# Altium integrated library Mastermind Devices.IntLib: 910 symbols (part 4 of 6)
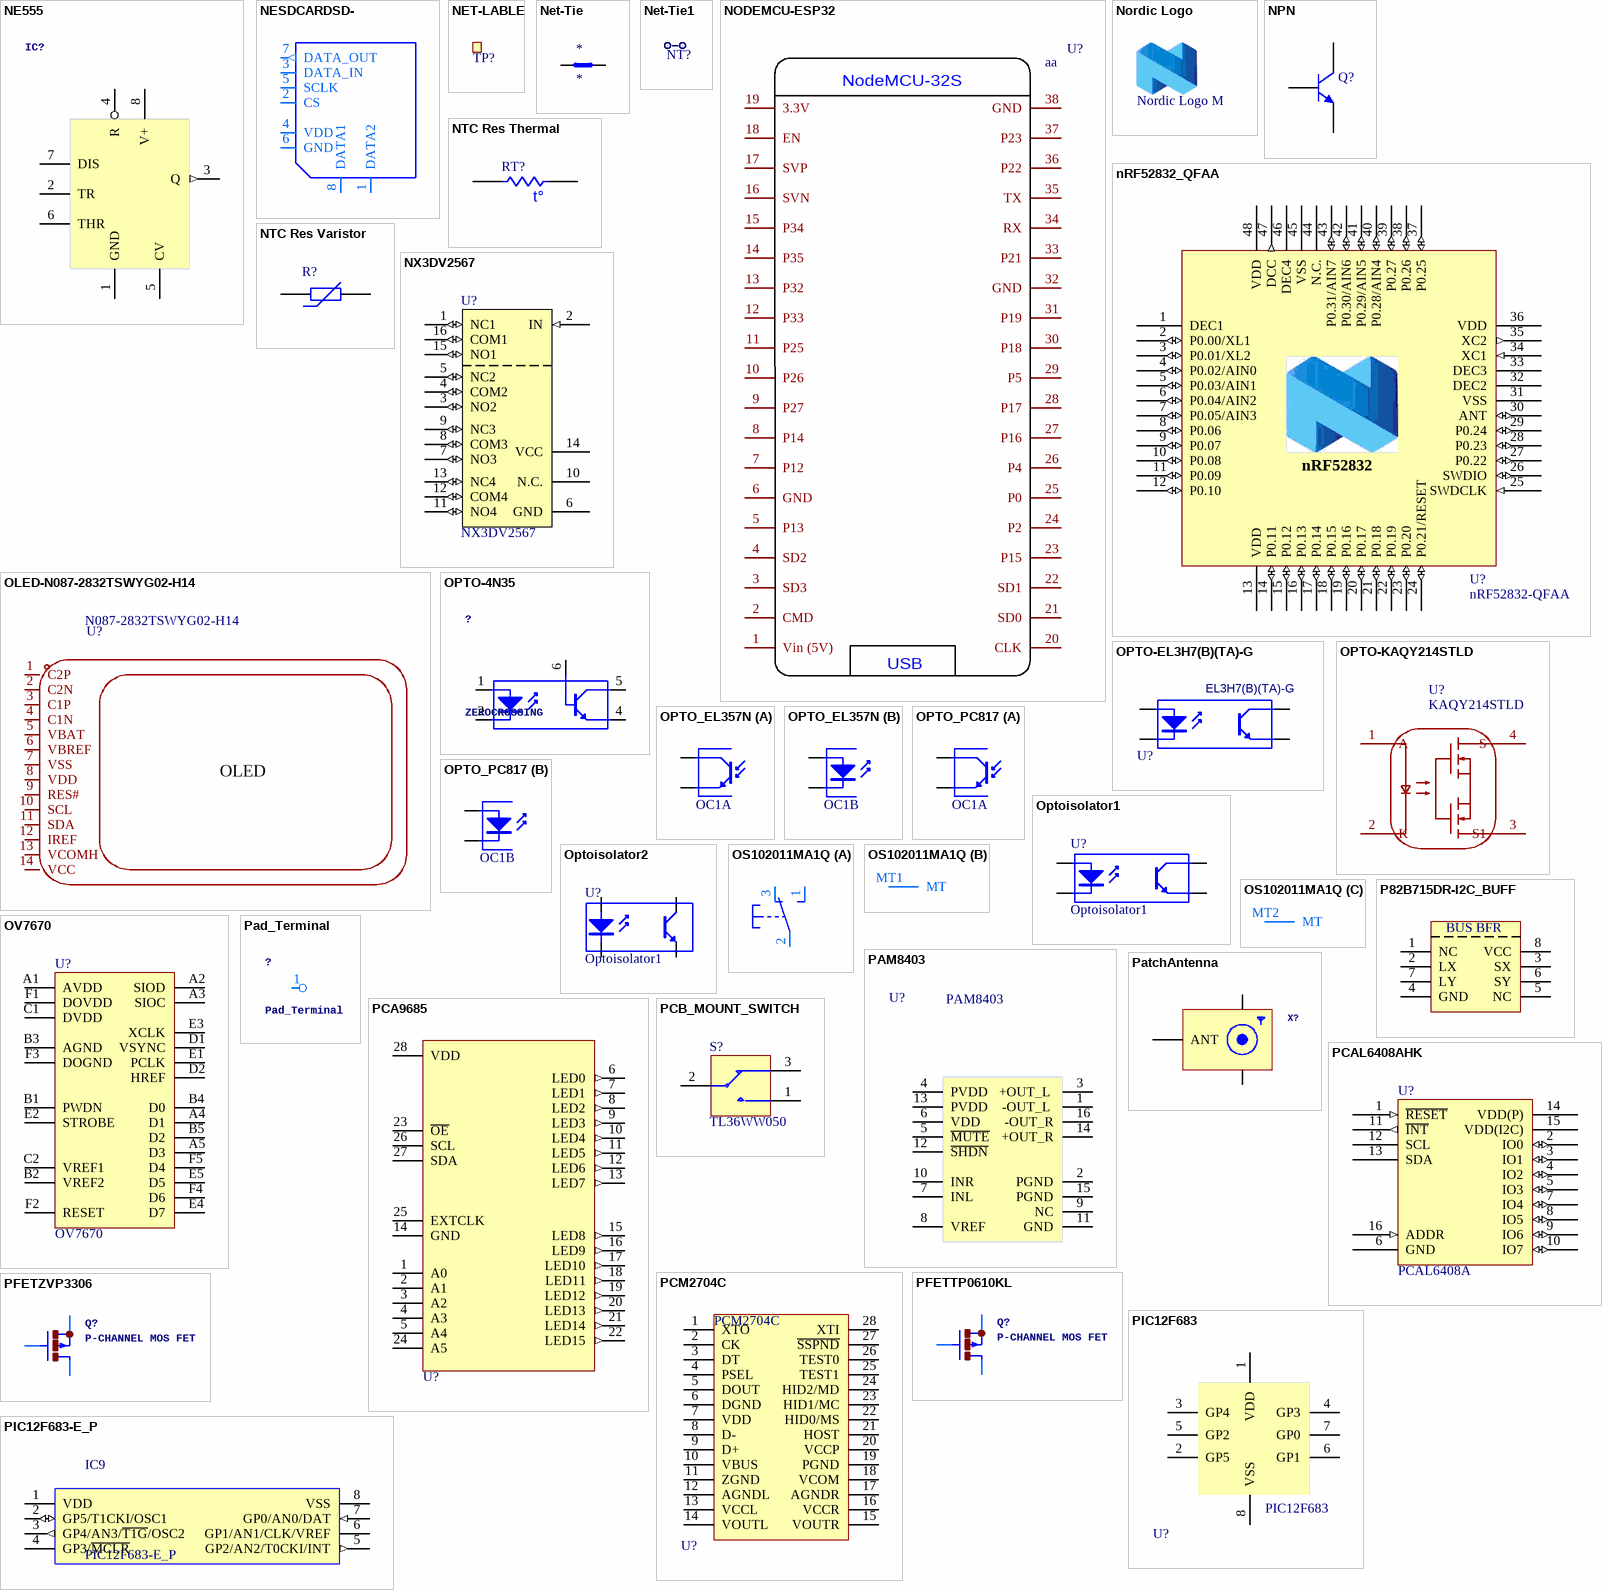
[diagram p42: symbols NE555 to PIC12F683-E_P]

## NX3DV2567
designator U?
Low-ohmic four-pole double-throw analog switch; Part Number: NX3DV2567GU; Manufacturer: NXP Semiconductors; 2nd source part number: 771-NX3DV2567GU115; Artikkelnr Noca: N.A.; Manufacturer Part Number: NX3DV2567GU; Datasheet: http://www.nxp.com/documents/data_sheet/NX3DV2567.pdf; Footprint Doc: XQFN-16; LatestRevisionDate: 2015-02-17; Pin Count: 16; Publisher: Nordic Semiconductor; Published: 2015-02-17; Value: NX3DV2567; Note: *; Supplier: Digi-Key; Supplier part number: 568-5206-1-ND; 2nd source Supplier: Mouser; Artikkelnr Simpro: N.A.
footprint XQFN40P180X260X50-16N
pins: 1 NC1 (io), 2 IN (in), 3 NO2 (io), 4 COM2 (io), 5 NC2 (io), 6 GND (power), 7 NO3 (io), 8 COM3 (io), 9 NC3 (io), 10 N.C., 11 NO4 (io), 12 COM4 (io), 13 NC4 (io), 14 VCC (power), 15 NO1 (io), 16 COM1 (io)

## OLED-N087-2832TSWYG02-H14
designator U?, comment N087-2832TSWYG02-H14
Manufacturer: Newvision(新智景); Add into BOM: yes; Symbol: N087-2832TSWYG02-H14; Device: N087-2832TSWYG02-H14; LCSC Part Name: 0.87寸 白光 128x32像素分辨率 14PIN; Supplier Part: C2890610; Manufacturer Part: N087-2832TSWYG02-H14; Supplier Footprint: -; JLCPCB Part Class: Extended Part; Datasheet: https://atta.szlcsc.com/upload/public/pdf/source/20220801/014279878C5155A8BB30742A627C84A8.pdf; Supplier: LCSC; Convert to PCB: yes
footprint OLED-SMD_N087-2832TSWYG02-H14_1
pins: 1 C2P, 2 C2N, 3 C1P, 4 C1N, 5 VBAT, 6 VBREF, 7 VSS, 8 VDD, 9 RES#, 10 SCL, 11 SDA, 12 IREF, 13 VCOMH, 14 VCC
text: OLED

## OPTO-4N35
designator ?, comment ZEROCROSSING
footprint DIL06F
pins: 1 A "Anode", 2 K "Cathode", 4 E "Emitter", 5 C "Collector", 6 B "Base"

## OPTO-EL3H7(B)(TA)-G
designator U?, comment EL3H7(B)(TA)-G
Photo transistor Optocoupler; Manufacturer: EVERLIGHT(亿光); Supplier: LCSC; Manufacturer Part: EL3H7(B)(TA)-G; Supplier Part: C32565; JLCPCB Part Class: Basic Part; spicePre: U; spiceSymbolName: EL3H7(B)(TA)-G
footprint SOP-4_L4.4-W2.8-P1.27-LS7.0-TL
pins: 1 A "Anode", 2 K "Cathode", 3 E "Emitter", 4 C "Collector"

## OPTO-KAQY214STLD
designator U?, comment KAQY214STLD
SSOP-4 Solid State Relays; Manufacturer: Cosmo(冠西); Add into BOM: yes; Contact Form: SPST-NO(1 Form A); Voltage - Forward(Vf): 1.2V; Load Voltage: 400V; Load Current: 130mA; RDS(on): 20Ω; Isolation Voltage(Vrms): 1.5kV; Turn-on time: 300us; Turn-off time: 100us; Symbol: KAQY214STLD; Device: KAQY214STLD; LCSC Part Name: 1 Form A(SPSTNO) 负载AC,DC 负载电压400V; Supplier Part: C113331; Manufacturer Part: KAQY214STLD; Supplier Footprint: SOP-4-2.54mm; JLCPCB Part Class: Extended Part; Datasheet: https://item.szlcsc.com/datasheet/KAQY214STLD/114566.html; Supplier: LCSC; Convert to PCB: yes
footprint SOP-4_L3.9-W4.4-P2.54-LS7.0-BR
3D model SOP-4_L4.0-W4.4-H2.1-LS7.0-P2.54
pins: 1 A, 2 K, 3 S1, 4 S

## OPTO_EL357N
designator OC1, comment EL357N  (value not drawn)
OC_FARNELL: unknown; OC_NEWARK: unknown
footprint EL357N
part A pins: 3 E "Emitter", 4 C "Collector"
part B pins: 1 A "Anode", 2 K "Cathode"

## OPTO_PC817
designator OC1, comment EL357N  (value not drawn)
OC_FARNELL: unknown; OC_NEWARK: unknown
footprint OPTO-SMD-4_L4.6-W6.5-P2.54-LS10.3-BL
part A pins: 3 E "Emitter", 4 C "Collector"
part B pins: 1 A "Anode", 2 K "Cathode"

## Optoisolator1
designator U?
4-Pin Phototransistor Optocoupler; Published: 24-Mar-1999; LatestRevisionDate: 04-Mar-2005; LatestRevisionNote: Sch pins 3 & 4 Swapped.; DatasheetVersion: Nov-2003; PackageReference: DIP-4; Publisher: Altium Limited
footprint DIP-4
pins: 1 A "Anode", 2 K "Cathode", 3 E "Emitter", 4 C "Collector"

## Optoisolator2
designator U?, comment Optoisolator1
4-Pin Phototransistor Optocoupler; Published: 24-Mar-1999; LatestRevisionDate: 04-Mar-2005; LatestRevisionNote: Sch pins 3 & 4 Swapped.; DatasheetVersion: Nov-2003; PackageReference: DIP-4; Publisher: Altium Limited
footprint DIP-4
pins: 1 A "Anode", 2 K "Cathode", 3 E "Emitter", 4 C "Collector"

## OS102011MA1Q
designator SW?, comment OS10201MA1Q through-hole right angle switch    http://www.ladyada.net/library/eagle  (value not drawn)
footprint OS102011MA1Q
part A pins: 1 S, 2 P, 3 O
part B pins: MT1 MT
part C pins: MT2 MT

## OV7670
designator U?
ALIENTEK OV7670 camera module; Manufacturer Part: N087-2832TSWYG02-H14; Add into BOM: yes; Supplier Footprint: -; JLCPCB Part Class: Extended Part; Datasheet: https://atta.szlcsc.com/upload/public/pdf/source/20220801/014279878C5155A8BB30742A627C84A8.pdf; Supplier: LCSC; Convert to PCB: yes
pins: A1 AVDD, A2 SIOD, A3 SIOC, A4 D1, A5 D3, B1 PWDN, B2 VREF2, B3 AGND, B4 D0, B5 D2, C1 DVDD, C2 VREF1, D1 VSYNC, D2 HREF, E1 PCLK, E2 STROBE, E3 XCLK, E4 D7, E5 D5, F1 DOVDD, F2 RESET, F3 DOGND, F4 D6, F5 D4

## P82B715DR-I2C_BUFF
designator U?, comment P82B715DR  (value not drawn)
I2C Bus Buffer; Manufacturer: TI(德州仪器); Add into BOM: yes; Input Type: 2-WireBus; Supply Voltage: 4.5V~12V; Number of Channels: 1; Input Capacitance: 3nF; Symbol: P82B715DR; Device: P82B715DR; LCSC Part Name: I2C Bus扩充器; Supplier Part: C2649394; Manufacturer Part: P82B715DR; Supplier Footprint: SOIC-8; JLCPCB Part Class: Extended Part; Datasheet: https://www.ti.com/cn/lit/gpn/p82b715; Supplier: LCSC; Convert to PCB: yes; Type: ；Buffers; Output Type: 2-WireBus; Operating Temperature: -40℃~+85℃; Application: I2C
footprint SOIC-8_L4.9-W3.9-P1.27-LS6.0-BL
footprint SOIC-8E (SOIC, 8-Leads, Body 4.90x3.90mm, Pitch 1.27mm, IPC Medium Density)
pins: 1 NC, 2 LX, 3 SX, 4 GND, 5 NC, 6 SY, 7 LY, 8 VCC
text: BUS BFR

## Pad_Terminal
designator ?
footprint PadCutOut_2.54mm
pins: 1

## PAM8403
designator U?
footprint SO-16
pins: 1 -OUT_L , 2 PGND, 3 +OUT_L , 4 PVDD, 5 ~{MUTE}, 6 VDD, 7 INL, 8 VREF, 9 NC, 10 INR, 11 GND, 12 ~{SHDN}, 13 PVDD, 14 +OUT_R, 15 PGND, 16 -OUT_R

## PatchAntenna
designator X?, comment SMA Connector   90Â° DIP SMA Connector, 50 Ohm (4UConnector: 07259)  (value not drawn)
footprint Patch_antenna
pins: 1 GND3 (power), 2 GND1 (power), 3 ANT

## PCA9685
designator U?, comment PCA9685 - 16 Channel 12-Bit I2C PWM Controller    5.0V tolerant 16 channel, 12-bit I2C PWM controller with 25mA per output (max. 400mA total)   Digikey: 568-5931-1-ND  (value not drawn)
footprint TSSOP28
pins: 1 A0, 2 A1, 3 A2, 4 A3, 5 A4, 6 LED0 (out), 7 LED1 (out), 8 LED2 (out), 9 LED3 (out), 10 LED4 (out), 11 LED5 (out), 12 LED6 (out), 13 LED7 (out), 14 GND, 15 LED8 (out), 16 LED9 (out), 17 LED10 (out), 18 LED11 (out), 19 LED12 (out), 20 LED13 (out), 21 LED14 (out), 22 LED15 (out), 23 ~{OE}, 24 A5, 25 EXTCLK, 26 SCL, 27 SDA, 28 VDD

## PCAL6408AHK
designator U?, comment PCAL6408A
8-bit I2C-bus I/O expander with interrupt output; Part Number: PCAL6408AHK; Manufacturer: NXP Semiconductors; 2nd source part number: 771-PCAL6408AHKX; Artikkelnr Noca: N.A.; Manufacturer Part Number: PCAL6408AHK; Datasheet: http://www.nxp.com/documents/data_sheet/PCAL6408A.pdf; Footprint Doc: XQFN-16; LatestRevisionDate: 2015-04-29; Pin Count: 16; Publisher: Nordic Semiconductor; Published: 2015-04-29; Value: PCAL6408A; Note: *; Supplier: Digi-Key; Supplier part number: 568-9944-2-ND; 2nd source Supplier: Mouser; Artikkelnr Simpro: N.A.
footprint XQFN40P180X260X50-16N
pins: 1 ~{RESET} (in), 2 IO0 (io), 3 IO1 (io), 4 IO2 (io), 5 IO3 (io), 6 GND (power), 7 IO4 (io), 8 IO5 (io), 9 IO6 (io), 10 IO7 (io), 11 ~{INT} (out), 12 SCL (power), 13 SDA, 14 VDD(P) (power) "VDD 2.3V - 5.5V", 15 VDD(I2C) (power), 16 ADDR (in)

## PCB_MOUNT_SWITCH
designator S?, comment TL36WW050
SPDT Subminiature Toggle Switch; Supplier: FARNELL; Supplier Code: 150-559
footprint PCB_SWITCH
3D model SPST_Switch (PCB3D Model)
pins: 1, 2, 3

## PCM2704C
designator U?
USB to Audio
footprint SOP65P780X200-28N
pins: 1 XTO, 2 CK, 3 DT, 4 PSEL, 5 DOUT, 6 DGND, 7 VDD, 8 D-, 9 D+, 10 VBUS, 11 ZGND, 12 AGNDL, 13 VCCL, 14 VOUTL, 15 VOUTR, 16 VCCR, 17 AGNDR, 18 VCOM, 19 PGND, 20 VCCP, 21 HOST, 22 HID0/MS, 23 HID1/MC, 24 HID2/MD, 25 TEST1, 26 TEST0, 27 ~{SSPND}, 28 XTI

## PFETTP0610KL
designator Q?, comment P-CHANNEL MOS FET
footprint TO92-OVAL
pins: 1 S, 2 G, 3 D

## PFETZVP3306
designator Q?, comment P-CHANNEL MOS FET
footprint TO92-OVAL
pins: 1 S, 2 G, 3 D

## PIC12F683
designator U?
PIC 20MHz DIP-8 Microcontrollers (MCU/MPU/SOC) ROHS; MFGPN: PIC12F683-I/P; Value: PIC12F683
footprint SOIC-8E (SOIC, 8-Leads, Body 4.90x3.90mm, Pitch 1.27mm, IPC Medium Density)
footprint DIL08-ROUND
pins: 1 VDD (power), 2 GP5, 3 GP4, 4 GP3 (power), 5 GP2, 6 GP1, 7 GP0, 8 VSS

## PIC12F683-E_P
designator IC9
Integrated Circuit; MFGPN: PIC12F683-E/P; Value: PIC12F683
footprint SOIC-8E (SOIC, 8-Leads, Body 4.90x3.90mm, Pitch 1.27mm, IPC Medium Density)
pins: 1 VDD (power), 2 GP5/T1CKI/OSC1 (io), 3 GP4/AN3/~{T1G}/OSC2 (out), 4 GP3/~{MCLR}, 5 GP2/AN2/T0CKI/INT (out), 6 GP1/AN1/CLK/VREF, 7 GP0/AN0/DAT (in), 8 VSS (power)

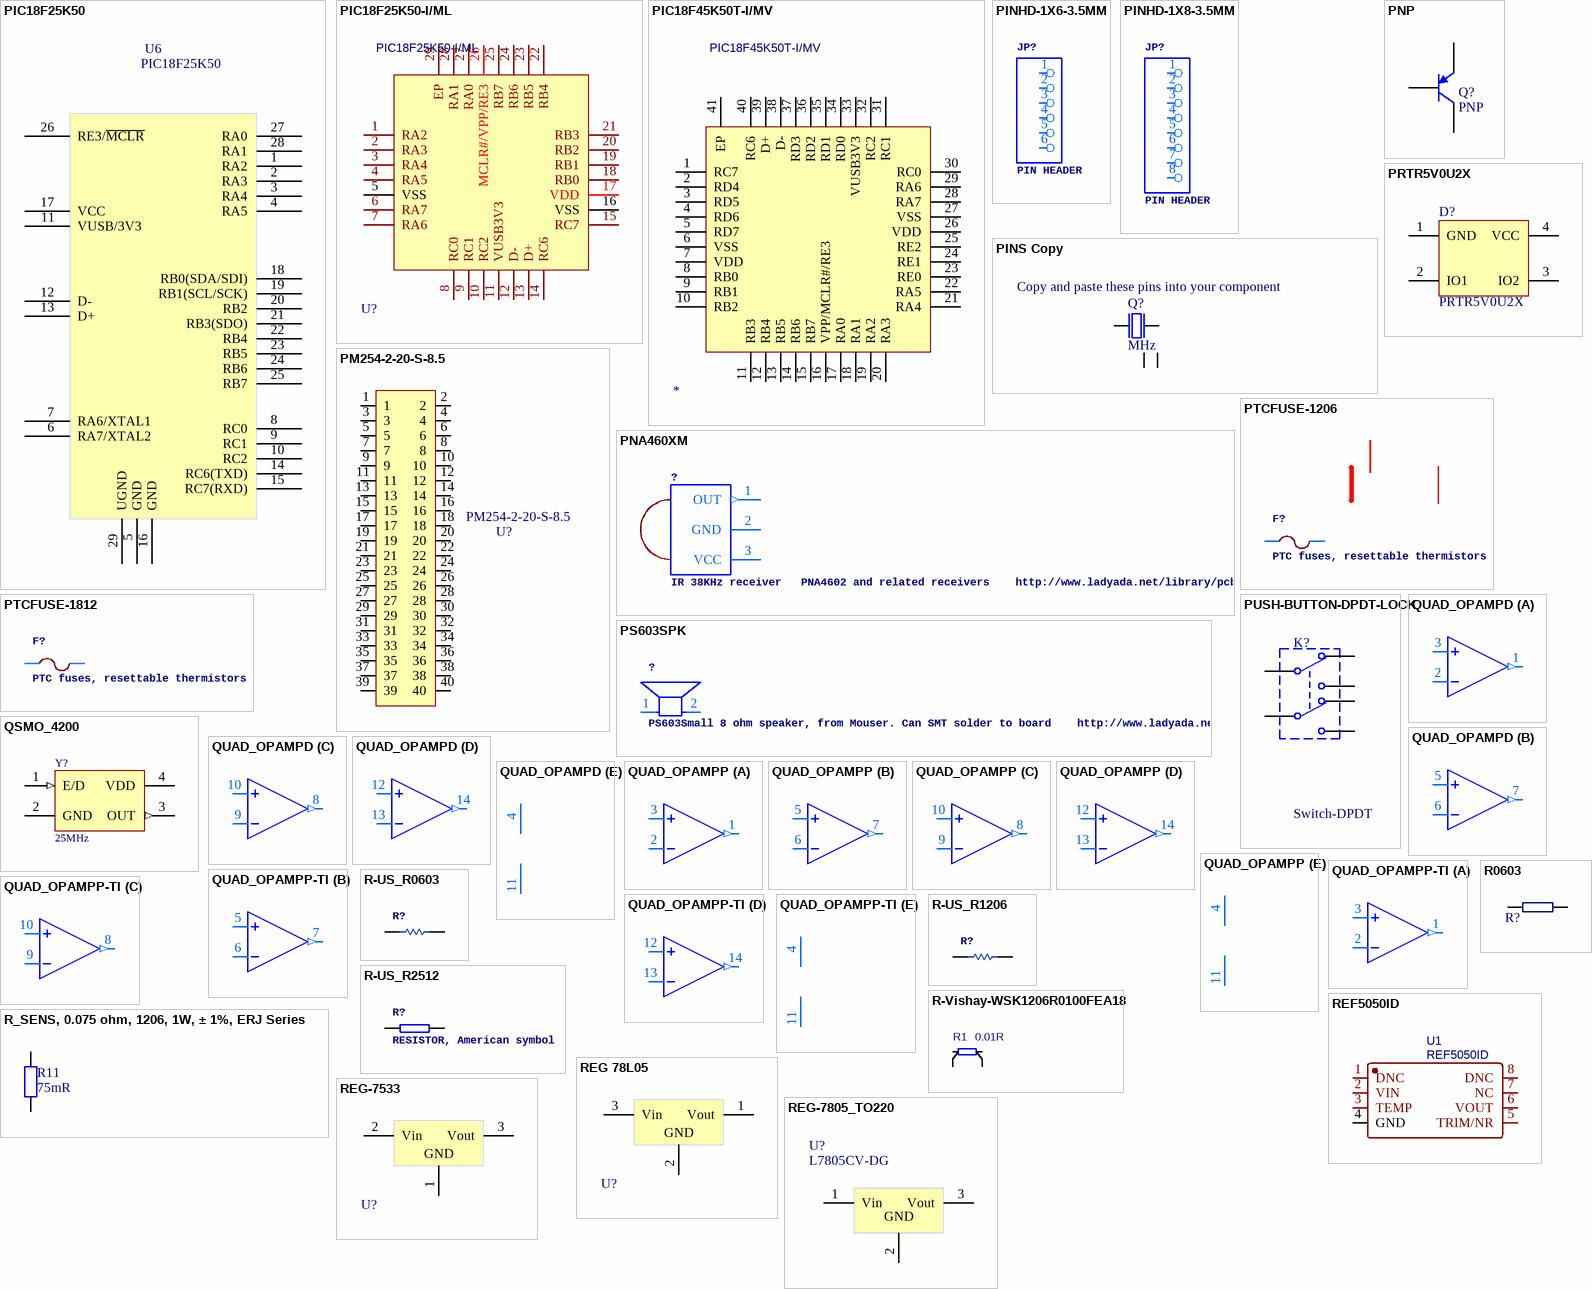
[diagram p22: symbols PIC18F25K50 to REG-7805_TO220]

## PIC18F25K50
designator U6
Manufacturer 1: Microchip / Atmel; Manufacturer Part Number 1: ATMEGA16U2-AU; Core Architecture: AVR; Data Bus Width: 8b; RAM Size: 512B; Interface: SPI,UART,USB,USART,Serial; Number of Timers/Counters: 2; Max Supply Voltage: 5.5V; Min Supply Voltage: 2.7V; Frequency: 16MHz; Number of Programmable I/O: 22; Watchdog Timer: Yes; Memory Type: FLASH; Memory Size: 16KB; Number of PWM Channels: 5; Oscillator Type: Internal; Number of SPI Channels: 1; Peripherals: Brown-out Detect/Reset,POR,PWM,WDT; Supplier 1: Digi-Key; Stock 1: 1738; Pricing 1: 1=2.45000, 25=2.25000, 100=2.04000 (USD); RoHS: Yes; Mount: Surface Mount; Case/Package: A; Number of Pins: 32; Contact Plating: Tin,Matte; Min Operating Temperature: -40°C; Max Operating Temperature: 85°C; Package Quantity: 1250; Packaging: Tray; Max Frequency: 16MHz; Number of I/Os: 22; Length: 7mm; Height: 1.05mm; Width: 7mm; REACH SVHC: No SVHC; Lead Free: Lead Free; ComponentLink1URL: https://datasheet.ciiva.com/13036/doc7799-28769-13036800.pdf?src-supplier=Mouser; ComponentLink1Description: https://datasheet.ciiva.com/13036/doc7799-28769-13036800.pdf?src-supplier=Mouser; ComponentLink2URL: https://datasheet.ciiva.com/22651/doc7799-22651110.pdf?src-supplier=Farnell; ComponentLink2Description: https://datasheet.ciiva.com/22651/doc7799-22651110.pdf?src-supplier=Farnell; Supplier Part Number 1: ATMEGA16U2-AU-ND
footprint QFN28-P0.65
pins: 1 RA2, 2 RA3, 3 RA4, 4 RA5, 5 GND, 6 RA7/XTAL2, 7 RA6/XTAL1, 8 RC0, 9 RC1, 10 RC2, 11 VUSB/3V3, 12 D-, 13 D+, 14 RC6(TXD), 15 RC7(RXD), 16 GND, 17 VCC, 18 RB0(SDA/SDI), 19 RB1(SCL/SCK), 20 RB2, 21 RB3(SDO), 22 RB4, 23 RB5, 24 RB6, 25 RB7, 26 RE3/~{MCLR}, 27 RA0, 28 RA1, 29 UGND

## PIC18F25K50-I/ML
designator U?
BOM_Manufacturer: MICROCHIP(美国微芯); Contributor: LCSC; BOM_Supplier: LCSC; BOM_Supplier Part: C184559; BOM_Manufacturer Part: PIC18F25K50-I/ML; BOM_JLCPCB Part Class: Extended Part; spicePre: U; spiceSymbolName: PIC18F25K50-I/ML
footprint QFN-28_L6.0-W6.0-P0.65-BL-EP
pins: 1 RA2, 2 RA3, 3 RA4, 4 RA5, 5 VSS, 6 RA7, 7 RA6, 8 RC0, 9 RC1, 10 RC2, 11 VUSB3V3, 12 D-, 13 D+, 14 RC6, 15 RC7, 16 VSS, 17 VDD, 18 RB0, 19 RB1, 20 RB2, 21 RB3, 22 RB4, 23 RB5, 24 RB6, 25 RB7, 26 MCLR#/VPP/RE3, 27 RA0, 28 RA1, 29 EP

## PIC18F45K50T-I/MV
designator *
BOM_Manufacturer: Microchip Tech; Contributor: LCSC; BOM_Supplier: LCSC; BOM_Supplier Part: C624362; BOM_Manufacturer Part: PIC18F45K50T-I/MV; BOM_JLCPCB Part Class: Extended Part; spicePre: U; spiceSymbolName: PIC18F45K50T-I/MV
footprint QFN-40_L5.0-W5.0-P0.40-BL-EP3.7
pins: 1 RC7, 2 RD4, 3 RD5, 4 RD6, 5 RD7, 6 VSS, 7 VDD, 8 RB0, 9 RB1, 10 RB2, 11 RB3, 12 RB4, 13 RB5, 14 RB6, 15 RB7, 16 VPP/MCLR#/RE3, 17 RA0, 18 RA1, 19 RA2, 20 RA3, 21 RA4, 22 RA5, 23 RE0, 24 RE1, 25 RE2, 26 VDD, 27 VSS, 28 RA7, 29 RA6, 30 RC0, 31 RC1, 32 RC2, 33 VUSB3V3, 34 RD0, 35 RD1, 36 RD2, 37 RD3, 38 D-, 39 D+, 40 RC6, 41 EP

## PINHD-1X6-3.5MM
designator JP?, comment PIN HEADER
footprint 1X06-3.5MM
pins: 1, 2, 3, 4, 5, 6

## PINHD-1X8-3.5MM
designator JP?, comment PIN HEADER
footprint 1X08-3.5MM
pins: 1, 2, 3, 4, 5, 6, 7, 8

## PINS Copy
designator Q?, comment MHz
CopyPins; Part Number: XTAL_SMD2016_32MHz_8pF_Epson; Manufacturer: Epson Toyocom; Manufacturer Part Number: Q22FA12800025; Note: XTAL SMD 32.000MHz; Artikkelnr Noca: N.A.; Datasheet: http://www.epsondevice.com/docs/qd/en/DownloadServlet?id=ID000449; LatestRevisionDate: 2014-11-27; Pin Count: 4; Publisher: Nordic Semiconductor; Published: 2012-03-09; Value: MHz; Supplier: Farnell; Supplier part number: 171-2806; 2nd source Supplier: *; 2nd source part number: *; Footprint Doc: XTAL_2016; Artikkelnr Simpro: N.A.
footprint 3225
pins: 1 inp, 2 GND, 3 out, 4 GND
text: Copy and paste these pins into your component

## PM254-2-20-S-8.5
designator U?
Manufacturer: HCTL(华灿天禄); Add into BOM: yes; Holes Structure: 2x20P; Pitch: 2.54mm; Circular Hole / Square Hole: 方孔; Number of Holes: 40P; Current Rating (Max): 3A; Holes Direction: Top; Soldering Temperature(Max): 260℃@5S; Symbol: PM254-2-20-S-8.5; Device: PM254-2-20-S-8.5; LCSC Part Name: 2x20P 间距:2.54mm 立贴; Supplier Part: C3975165; Manufacturer Part: PM254-2-20-S-8.5; Supplier Footprint: SMD,P=2.54mm; JLCPCB Part Class: Extended Part; Datasheet: https://atta.szlcsc.com/upload/public/pdf/source/20230609/7C6F8D8E301C6BBC8F19D55951C36597.pdf; Supplier: LCSC; Convert to PCB: yes; Row Spacing: 2.54mm; Mounting Type: Brick nogging; Number of Rows: 双排; Insulation Height: 8.5mm; Contact Material: Copper Alloy; Operating Temperature Range: -40℃~+105℃
footprint HDR-SMD_40P-P2.54-V-F-R2-C20-S2.54-LS7.1
3D model HDR-SMD_40P-P2.54-V-F-R2-C20-S2.54-LS7.1
pins: 1, 2, 3, 4, 5, 6, 7, 8, 9, 10, 11, 12, 13, 14, 15, 16, 17, 18, 19, 20, 21, 22, 23, 24, 25, 26, 27, 28, 29, 30, 31, 32, 33, 34, 35, 36, 37, 38, 39, 40

## PNA460XM
designator ?, comment IR 38KHz receiver   PNA4602 and related receivers    http://www.ladyada.net/library/pcb/eaglelibrary.html
footprint PNA460XM
pins: 1 OUT (out), 2 GND (power), 3 VCC (power)

## PNP
designator Q?
PNP Bipolar Transistor; Published: 8-Jun-2000; LatestRevisionDate: 15-Jan-2003; LatestRevisionNote: PCB Footprint 'BCY-W3/D4.7' replaced; DatasheetVersion: 1997; PackageVersion: Sep-1998; PackageReference: TO-92A; Publisher: Altium Limited; PackageDescription: TO, Flat Index; 3 In-Line, Axial Leads; Body Dia. 4.5mm; Leads 0.51 x 0.48 mm (max); ComponentLink1Description: Manufacturer Link; ComponentLink1URL: http://www.fairchildsemi.com/; ComponentLink2Description: Datasheet; ComponentLink2URL: http://www.fairchildsemi.com/ds/2N%2F2N3906.pdf
simulation model 2N3906 (PNP)
signal-integrity model 2N3906
footprint SOT23
pins: 1 E, 2 B, 3 C

## PRTR5V0U2X
designator D?
Ultra low capacitance double rail-to-rail ESD protection diode; Manufacturer: NXP; 2nd source part number: 152-4157; Artikkelnr Noca: 10069015; Artikkelnr Simpro: N.A.; Part Number: PRTR5V0U2X; Manufacturer Part Number: PRTR5V0U2X; Datasheet: http://www.farnell.com/datasheets/109718.pdf; LatestRevisionDate: 2012-06-11; Publisher: Nordic Semiconductor; Published: 2012-06-11; Value: PRTR5V0U2X; Note: *; Supplier: Digi-Key; Supplier part number: 568-4140-1-ND; 2nd source Supplier: Farnell; Footprint Doc: SOT-143B
footprint SOT190P230X110-4L
pins: 1 GND, 2 IO1, 3 IO2, 4 VCC

## PS603SPK
designator ?, comment PS603Small 8 ohm speaker, from Mouser. Can SMT solder to board    http://www.ladyada.net/library/pcb/eaglelibrary.html
footprint PS603
pins: 1, 2

## PTCFUSE-1206
designator F?, comment PTC fuses, resettable thermistors
footprint F1206
footprint F1206 - NO
pins: 1, 2

## PTCFUSE-1812
designator F?, comment PTC fuses, resettable thermistors
footprint 1812
pins: 1, 2

## PUSH-BUTTON-DPDT-LOCK
designator K?, comment Switch-DPDT
Dual-Pole Dual-Throw button; Published: 24-Mar-1999; LatestRevisionDate: 17-Jul-2002; LatestRevisionNote: Re-released for DXP Platform.; PackageReference: DIP-P8; Publisher: Altium Limited; PackageDescription: Relay; 8 Leads
footprint SW-TH_BTSA-X-P-14
footprint SW-TH_BTSA-X-P-15
pins: 1, 2, 3, 4, 5, 6

## QSMO_4200
designator Y?, comment 25MHz
Surface Mount Crystal Oscillator
footprint QSMO_4200
3D model crystal (PCB3D Model)
pins: 1 E/D (in) "Low Disables Clock", 2 GND (power), 3 OUT (out) "Output", 4 VDD (power)

## QUAD_OPAMPD
designator IC?, comment OP AMPStandard quad package  (value not drawn)
footprint SO14
part A pins: 1 OUT (out), 2 -IN, 3 +IN
part B pins: 5 +IN, 6 -IN, 7 OUT (out)
part C pins: 8 OUT (out), 9 -IN, 10 +IN
part D pins: 12 +IN, 13 -IN, 14 OUT (out)
part E pins: 4 V+ (power), 11 V- (power)

## QUAD_OPAMPP
designator IC?, comment OP AMPStandard quad package  (value not drawn)
footprint DIL14
part A pins: 1 OUT (out), 2 -IN, 3 +IN
part B pins: 5 +IN, 6 -IN, 7 OUT (out)
part C pins: 8 OUT (out), 9 -IN, 10 +IN
part D pins: 12 +IN, 13 -IN, 14 OUT (out)
part E pins: 4 V+ (power), 11 V- (power)

## QUAD_OPAMPP-TI
designator IC?, comment OP AMPStandard quad package  (value not drawn)
footprint DIL14-LARDO
part A pins: 1 OUT (out), 2 -IN, 3 +IN
part B pins: 5 +IN, 6 -IN, 7 OUT (out)
part C pins: 8 OUT (out), 9 -IN, 10 +IN
part D pins: 12 +IN, 13 -IN, 14 OUT (out)
part E pins: 4 V+ (power), 11 V- (power)

## R0603
designator R?, comment 5%  (value not drawn)
Chip resistor
footprint R0805
footprint R0603
footprint R1206
pins: 1, 2

## R-US_R0603
designator R?
RESISTOR, American symbol; Parameter 1: *
footprint R0603
pins: 1, 2

## R-US_R1206
designator R?  (value not drawn)
RESISTOR, American symbol
footprint R1206
pins: 1, 2

## R-US_R2512
designator R?, comment RESISTOR, American symbol
footprint R2512
pins: 1, 2

## R-Vishay-WSK1206R0100FEA18
designator R1, comment 0.01R
10 mOhms ±1% 0.5W,Chip Resistor 1206 (3216 Metric) Current Sense, Moisture Resistant, Pulse Withstanding Metal Element; Manufacturer Name: Vishay; Manufacturer Part No.: WSK1206R0100FEA18; Rating: 0.5W; Tolerance: 1%; Value: 0.01R; ClassName: Power_Poly
footprint RESWSK1206 (4-terminal resistor 1206 (3216 metric))
pins: 1, 2, 3, 4

## R_SENS, 0.075 ohm, 1206, 1W, ± 1%, ERJ Series
designator R11, comment 75mR
SMD Chip Resistor, Thick Film, Current Sense Resistors - SMD 1W 0.075ohm 1%; MPN: ERJ-8BWFR075V; VoltageRating: 50V; Temp coefficient: *ppm; MF: Panasonic Electronic Components; Precision: 1%; PowerRating: 1W; Resistance: 75mR
footprint R1206 (1206 resistor)
pins: 1, 2

## REF5050ID
designator U1
BOM_Manufacturer: TI(德州仪器); Contributor: LCSC; BOM_Supplier: LCSC; BOM_Supplier Part: C1575348; BOM_Manufacturer Part: REF5050ID; link: https://atta.szlcsc.comnull; BOM_JLCPCB Part Class: Extended Part; spicePre: U; spiceSymbolName: REF5050ID
footprint SOIC-8E (SOIC, 8-Leads, Body 4.90x3.90mm, Pitch 1.27mm, IPC Medium Density)
pins: 1 DNC, 2 VIN, 3 TEMP, 4 GND, 5 TRIM/NR, 6 VOUT, 7 NC, 8 DNC

## REG 78L05
designator U?, comment 78L05  (value not drawn)
IC REG LINEAR 5V 100MA SOT89-3; @Comment: *
footprint SOT89-3
pins: 1 Vout, 2 GND, 3 Vin

## REG-7533
designator U?, comment HT7333  (value not drawn)
3.3VLTTR 250ma, 3.3V Micropower Low Dropout Regulator, 5-Pin SC70-5; @Comment: *
footprint SOT89-3
pins: 1 GND, 2 Vin, 3 Vout

## REG-7805_TO220
designator U?, comment L7805CV-DG
Fixed 5V TO-220 Voltage Regulators - Linear, Low Drop Out (LDO) Regulators ROHS
footprint TO220
pins: 1 Vin, 2 GND, 3 Vout

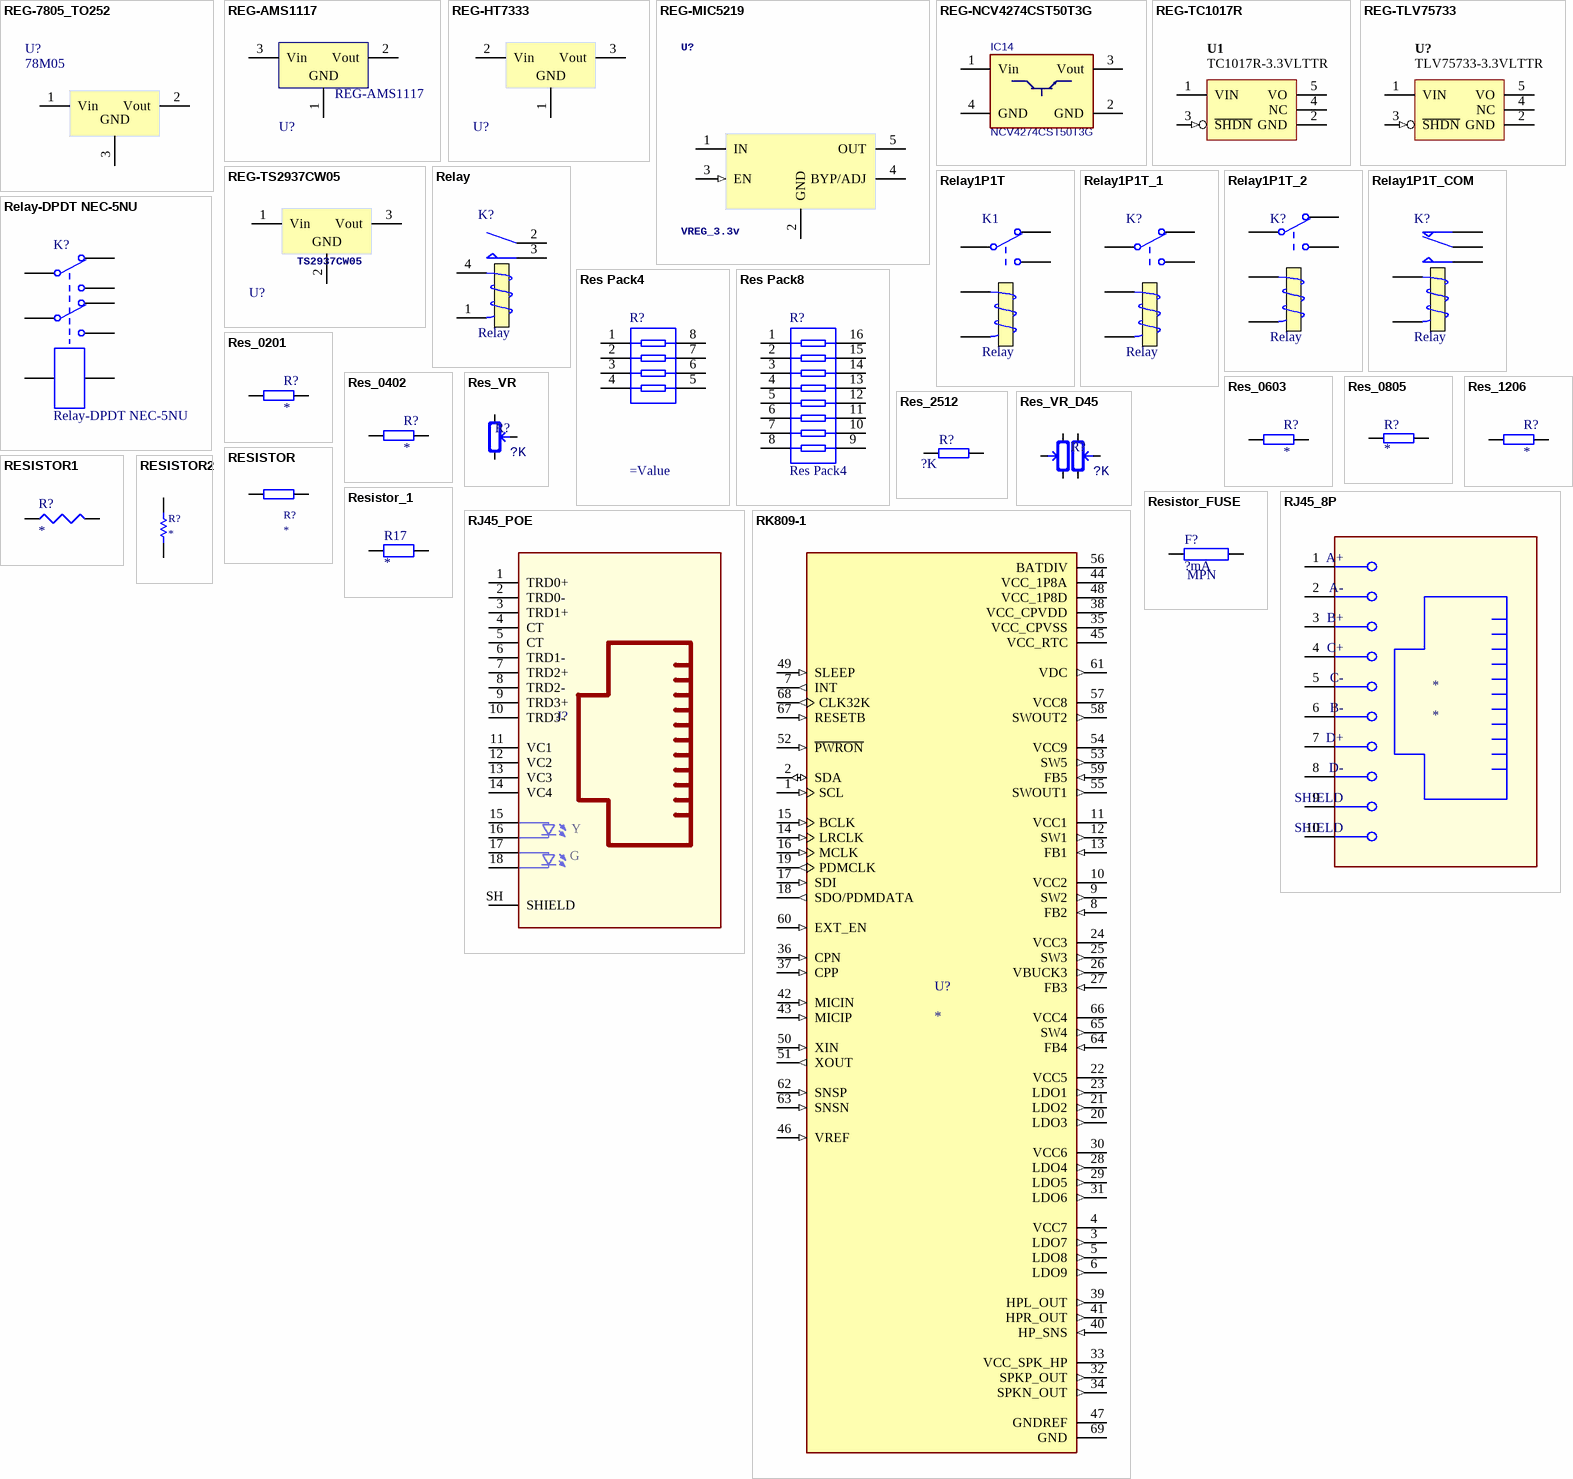
[diagram p23: symbols REG-7805_TO252 to RK809-1]

## REG-7805_TO252
designator U?, comment 78M05
5V Linear Regulator
footprint TO252
pins: 1 Vin, 2 Vout, 3 GND

## REG-AMS1117
designator U?
3V3 700ma Linear Regualtor; Max Input Voltage: 12V
footprint SOT223
footprint SOT89-3
pins: 1 GND, 2 Vout, 3 Vin

## REG-HT7333
designator U?, comment HT7333  (value not drawn)
3.3VLTTR 250ma, 3.3V Micropower Low Dropout Regulator, 5-Pin SC70-5; @Comment: *
footprint SOT89-3
pins: 1 GND, 2 Vin, 3 Vout

## REG-MIC5219
designator U?, comment VREG_3.3v
LOW DROPOUT REGULATORS(LDO) POSITIVE FIXED 600MV @ 500MA 12V 3.3V 500MA SOT-23-5 ROHS
footprint SOT23-5L
pins: 1 IN, 2 GND, 3 EN (in), 4 BYP/ADJ, 5 OUT

## REG-NCV4274CST50T3G
designator IC14, comment NCV4274CST50T3G
LDO regulator, Vout = 5V, Iout(max) = 0.4A, Vin = 5.5V to 40V, SOT-223; Manufacturer Name: ON Semiconductor; Manufacturer Part No.: NCV4274CST50T3G
footprint T_ON_NCV4264-2ST50T3G (SO4)
pins: 1 Vin, 2 GND, 3 Vout, 4 GND

## REG-TC1017R
designator U1, comment TC1017R-3.3VLTTR
3.3VLTTR, 3.3V Micropower Low Dropout Regulator, 5-Pin SC70-5; Max Input Voltage: 5.5 V; Max Output Current: 150 mA; Min Input Voltage: mV; Supply Voltage: V; Max Output Voltage: 3.3 V; Min Output Voltage: mV; Mounting Technology: Surface Mount; Status: Unreleased; Temperature Range: -40 to 85 degC; Category: IC-Power
footprint SOT65P210X80-5N
pins: 1 VIN (power), 2 GND (power), 3 ~{SHDN} (in), 4 NC, 5 VO (power)

## REG-TLV75733
designator U?, comment TLV75733-3.3VLTTR
3.3VLTTR 1A, 3.3V Micropower Low Dropout Regulator, VINmax 5.5V; Max Output Current: 1000 mA; Min Input Voltage: mV; Supply Voltage: V; Max Input Voltage: 5.5 V; Max Output Voltage: 3.3 V; Min Output Voltage: mV; Mounting Technology: Surface Mount; Status: Unreleased; Temperature Range: -40 to 85 degC; Category: IC-Power
footprint SOT23-5L
pins: 1 VIN, 2 GND (power), 3 ~{SHDN} (in), 4 NC, 5 VO

## REG-TS2937CW05
designator U?, comment TS2937CW05
5V Linear Regulator
footprint SOT223
pins: 1 Vin, 2 GND, 3 Vout